# Altium footprint library ZYF_IC.PcbLib: 42 footprints (part 1 of 3)
Each footprint in its own frame and in the unit in brackets; x right, y up, seen from the top. Pads: shape width x height; smd on the part's side, far side on the other; paste and mask are expansions set on the pad; w line width, h text height; cw(c..) or ccw(c..) is an arc to the next point about the centre after c.
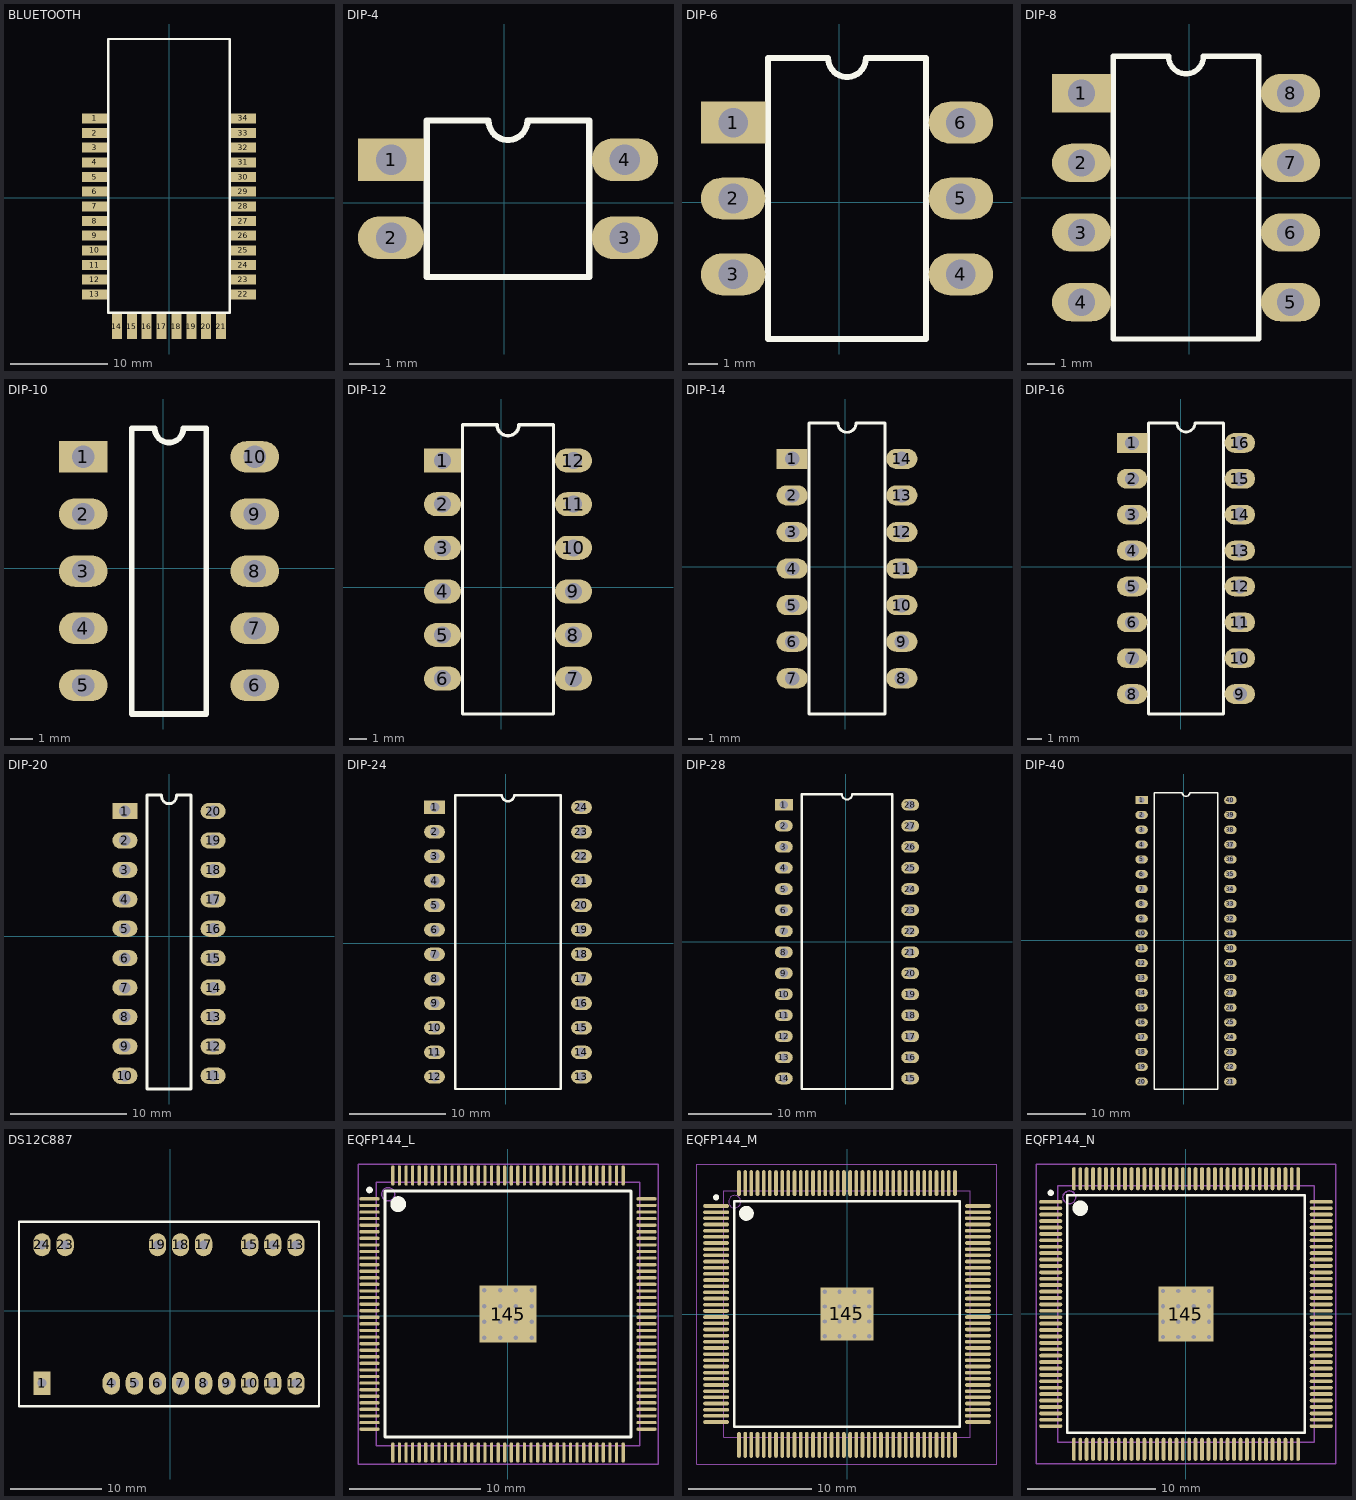
[diagram p0: the footprints below, top view; thin cyan lines are the x and y axes]

## BLUETOOTH [mil]
pads (34):
  rect 100x40 smd: 1(-300,320) 2(-300,260.83) 3(-300,201.67) 4(-300,142.5) 5(-300,83.33) 6(-300,24.17) 7(-300,-35) 8(-300,-94.17) 9(-300,-153.33) 10(-300,-212.5) 11(-300,-271.67) 12(-300,-330.83) 13(-300,-390) 22(300,-390) 23(300,-330.83) 24(300,-271.67) 25(300,-212.5) 26(300,-153.33) 27(300,-94.17) 28(300,-35) 29(300,24.17) 30(300,83.33) 31(300,142.5) 32(300,201.67) 33(300,260.83) 34(300,320)
  rect 40x100 smd: 14(-210,-520) 15(-150,-520) 16(-90,-520) 17(-30,-520) 18(30,-520) 19(90,-520) 20(150,-520) 21(210,-520)
Top Overlay:
  lines w10: -245,-465 245,-465 245,640 -245,640 -245,-465

## DIP-4 [mil]
pads (4):
  rect 85x55 hole 39: 1(-145,55)
  oval 85x55 hole 39: 2(-145,-45) 3(155,-45) 4(155,55)
Top Overlay:
  lines w7.87: -99.33,-95.39 109.33,-95.39 109.33,105.39 30,105.39 cw(c5,105.39) -20,105.39 -99.33,105.39 -99.33,-95.39
3D body: height 169.69, standoff -129.13, extent -147.48,-105 167.48,113.11

## DIP-6 [mil]
pads (6):
  rect 85x55 hole 39 paste+0 mask+4: 1(-140,105)
  oval 85x55 hole 39 paste+0 mask+4: 2(-140,5) 3(-140,-95) 4(160,-95) 5(160,5) 6(160,105)
Top Overlay:
  lines w7.87: -94.33,-180.04 -94.33,190.04 -15,190.04 ccw(c10,190.04) 35,190.04 114.33,190.04 114.33,-180.04 -94.33,-180.04
3D body: height 208.66, standoff -78.74, extent -144.92,-140 164.92,140.31

## DIP-8 [mil]
pads (8):
  rect 85x55 hole 39: 1(-155,150)
  oval 85x55 hole 39: 2(-155,50) 3(-155,-50) 4(-155,-150) 5(145,-150) 6(145,-50) 7(145,50) 8(145,150)
Top Overlay:
  lines w7.87: -109.33,-202.76 99.33,-202.76 99.33,202.76 20,202.76 cw(c-5,202.76) -30,202.76 -109.33,202.76 -109.33,-202.76
3D body: height 200, standoff -137.8, extent -159.91,-204.95 149.93,224.97

## DIP-10 [mil]
pads (10):
  rect 85x55 hole 39: 1(-140,195)
  oval 85x55 hole 39: 2(-140,95) 3(-140,-5) 4(-140,-105) 5(-140,-205) 6(160,-205) 7(160,-105) 8(160,-5) 9(160,95) 10(160,195)
Top Overlay:
  lines w10: -55,-255 75,-255 75,245 35,245 cw(c10,245) -15,245 -55,245 -55,-255

## DIP-12 [mil]
pads (12):
  rect 85x55 hole 39: 1(-135,290)
  oval 85x55 hole 39: 2(-135,190) 3(-135,90) 4(-135,-10) 5(-135,-110) 6(-135,-210) 7(165,-210) 8(165,-110) 9(165,-10) 10(165,90) 11(165,190) 12(165,290)
Top Overlay:
  lines w7.87: -89.33,-291.1 119.33,-291.1 119.33,371.89 40,371.89 cw(c15,371.89) -10,371.89 -89.33,371.89 -89.33,-291.1

## DIP-14 [mil]
pads (14):
  rect 85x55 hole 39: 1(-145,295)
  oval 85x55 hole 39: 2(-145,195) 3(-145,95) 4(-145,-5) 5(-145,-105) 6(-145,-205) 7(-145,-305) 8(155,-305) 9(155,-205) 10(155,-105) 11(155,-5) 12(155,95) 13(155,195) 14(155,295)
Top Overlay:
  lines w7.87: -99.33,-402.64 -99.33,392.64 -20,392.64 ccw(c5,392.64) 30,392.64 109.33,392.64 109.33,-402.64 -99.33,-402.64
3D body: height 200.79, standoff -129.92, extent -144.91,-403.69 164.93,383.71

## DIP-16 [mil]
pads (16):
  rect 85x55 hole 39: 1(-135,345)
  oval 85x55 hole 39: 2(-135,245) 3(-135,145) 4(-135,45) 5(-135,-55) 6(-135,-155) 7(-135,-255) 8(-135,-355) 9(165,-355) 10(165,-255) 11(165,-155) 12(165,-55) 13(165,45) 14(165,145) 15(165,245) 16(165,345)
Top Overlay:
  lines w7.87: -89.33,-410.51 119.33,-410.51 119.33,400.51 40,400.51 cw(c15,400.51) -10,400.51 -89.33,400.51 -89.33,-410.51
3D body: height 200.79, standoff -129.92, extent -139.92,-403.69 169.93,383.7

## DIP-20 [mil]
pads (20):
  rect 85x55 hole 39: 1(-150,425)
  oval 85x55 hole 39: 2(-150,325) 3(-150,225) 4(-150,125) 5(-150,25) 6(-150,-75) 7(-150,-175) 8(-150,-275) 9(-150,-375) 10(-150,-475) 11(150,-475) 12(150,-375) 13(150,-275) 14(150,-175) 15(150,-75) 16(150,25) 17(150,125) 18(150,225) 19(150,325) 20(150,425)
Top Overlay:
  lines w10: -25,480 -75,480 -75,-520 75,-520 75,480 25,480 ; -24.82,477.98 ccw(c0,475) 24.82,477.98
3D body: height 177.17, standoff -137.8, extent -152.77,-520.37 152.77,487.5

## DIP-24 [mil]
pads (24):
  rect 85x55 hole 39: 1(-290,555)
  oval 85x55 hole 39: 2(-290,455) 3(-290,355) 4(-290,255) 5(-290,155) 6(-290,55) 7(-290,-45) 8(-290,-145) 9(-290,-245) 10(-290,-345) 11(-290,-445) 12(-290,-545) 13(310,-545) 14(310,-445) 15(310,-345) 16(310,-245) 17(310,-145) 18(310,-45) 19(310,55) 20(310,155) 21(310,255) 22(310,355) 23(310,455) 24(310,555)
Top Overlay:
  lines w10: -205,-595 -205,605 -15,605 ccw(c10,605) 35,605 225,605 225,-595 -205,-595
3D body: height 224.41, standoff -101.57, extent -289.92,-635.03 319.92,635.05

## DIP-28 [mil]
pads (28):
  rect 85x55 hole 39: 1(-295,650)
  oval 85x55 hole 39: 2(-295,550) 3(-295,450) 4(-295,350) 5(-295,250) 6(-295,150) 7(-295,50) 8(-295,-50) 9(-295,-150) 10(-295,-250) 11(-295,-350) 12(-295,-450) 13(-295,-550) 14(-295,-650) 15(305,-650) 16(305,-550) 17(305,-450) 18(305,-350) 19(305,-250) 20(305,-150) 21(305,-50) 22(305,50) 23(305,150) 24(305,250) 25(305,350) 26(305,450) 27(305,550) 28(305,650)
Top Overlay:
  lines w10: -210,-700 220,-700 220,700 30,700 cw(c5,700) -20,700 -210,700 -210,-700
3D body: height 227.95, standoff -129.92, extent -294.91,-740.03 304.93,730.05

## DIP-40 [mil]
pads (40):
  rect 85x55 hole 39: 1(-285,945)
  oval 85x55 hole 39: 2(-285,845) 3(-285,745) 4(-285,645) 5(-285,545) 6(-285,445) 7(-285,345) 8(-285,245) 9(-285,145) 10(-285,45) 11(-285,-55) 12(-285,-155) 13(-285,-255) 14(-285,-355) 15(-285,-455) 16(-285,-555) 17(-285,-655) 18(-285,-755) 19(-285,-855) 20(-285,-955) 21(315,-955) 22(315,-855) 23(315,-755) 24(315,-655) 25(315,-555) 26(315,-455) 27(315,-355) 28(315,-255) 29(315,-155) 30(315,-55) 31(315,45) 32(315,145) 33(315,245) 34(315,345) 35(315,445) 36(315,545) 37(315,645) 38(315,745) 39(315,845) 40(315,945)
Top Overlay:
  lines w10: -200,-1005 -200,995 -10,995 ccw(c15,995) 40,995 230,995 230,-1005 -200,-1005
3D body: height 196.46, standoff -125.2, extent -285.23,-1045.43 325,1025.43

## DS12C887 [mil]
pads (18):
  rect 75x100 hole 39: 1(-555,-315)
  oval 75x100 hole 39: 4(-255,-315) 5(-155,-315) 6(-55,-315) 7(45,-315) 8(145,-315) 9(245,-315) 10(345,-315) 11(445,-315) 12(545,-315) 13(545,285) 14(445,285) 15(345,285) 17(145,285) 18(45,285) 19(-55,285) 23(-455,285) 24(-555,285)
Top Overlay:
  lines w10: -655,-415 645,-415 645,385 -655,385 -655,-415

## EQFP144_L [mm]
pads (145):
  oval 1.55x0.25 smd: 1(-10.51,8.889) 2(-10.51,8.389) 3(-10.51,7.889) 4(-10.51,7.389) 5(-10.51,6.889) 6(-10.51,6.389) 7(-10.51,5.889) 8(-10.51,5.389) 9(-10.51,4.889) 10(-10.51,4.389) 11(-10.51,3.889) 12(-10.51,3.389) 13(-10.51,2.889) 14(-10.51,2.389) 15(-10.51,1.889) 16(-10.51,1.389) 17(-10.51,0.889) 18(-10.51,0.389) 19(-10.51,-0.111) 20(-10.51,-0.611) 21(-10.51,-1.111) 22(-10.51,-1.611) 23(-10.51,-2.111) 24(-10.51,-2.611) 25(-10.51,-3.111) 26(-10.51,-3.611) 27(-10.51,-4.111) 28(-10.51,-4.611) 29(-10.51,-5.111) 30(-10.51,-5.611) 31(-10.51,-6.111) 32(-10.51,-6.611) 33(-10.51,-7.111) 34(-10.51,-7.611) 35(-10.51,-8.111) 36(-10.51,-8.611) 73(10.54,-8.611) 74(10.54,-8.111) 75(10.54,-7.611) 76(10.54,-7.111) 77(10.54,-6.611) 78(10.54,-6.111) 79(10.54,-5.611) 80(10.54,-5.111) 81(10.54,-4.611) 82(10.54,-4.111) 83(10.54,-3.611) 84(10.54,-3.111) 85(10.54,-2.611) 86(10.54,-2.111) 87(10.54,-1.611) 88(10.54,-1.111) 89(10.54,-0.611) 90(10.54,-0.111) 91(10.54,0.389) 92(10.54,0.889) 93(10.54,1.389) 94(10.54,1.889) 95(10.54,2.389) 96(10.54,2.889) 97(10.54,3.389) 98(10.54,3.889) 99(10.54,4.389) 100(10.54,4.889) 101(10.54,5.389) 102(10.54,5.889) 103(10.54,6.389) 104(10.54,6.889) 105(10.54,7.389) 106(10.54,7.889) 107(10.54,8.389) 108(10.54,8.889)
  oval 0.25x1.55 smd: 37(-8.735,-10.386) 38(-8.235,-10.386) 39(-7.735,-10.386) 40(-7.235,-10.386) 41(-6.735,-10.386) 42(-6.235,-10.386) 43(-5.735,-10.386) 44(-5.235,-10.386) 45(-4.735,-10.386) 46(-4.235,-10.386) 47(-3.735,-10.386) 48(-3.235,-10.386) 49(-2.735,-10.386) 50(-2.235,-10.386) 51(-1.735,-10.386) 52(-1.235,-10.386) 53(-0.735,-10.386) 54(-0.235,-10.386) 55(0.265,-10.386) 56(0.765,-10.386) 57(1.265,-10.386) 58(1.765,-10.386) 59(2.265,-10.386) 60(2.765,-10.386) 61(3.265,-10.386) 62(3.765,-10.386) 63(4.265,-10.386) 64(4.765,-10.386) 65(5.265,-10.386) 66(5.765,-10.386) 67(6.265,-10.386) 68(6.765,-10.386) 69(7.265,-10.386) 70(7.765,-10.386) 71(8.265,-10.386) 72(8.765,-10.386) 109(8.765,10.664) 110(8.265,10.664) 111(7.765,10.664) 112(7.265,10.664) 113(6.765,10.664) 114(6.265,10.664) 115(5.765,10.664) 116(5.265,10.664) 117(4.765,10.664) 118(4.265,10.664) 119(3.765,10.664) 120(3.265,10.664) 121(2.765,10.664) 122(2.265,10.664) 123(1.765,10.664) 124(1.265,10.664) 125(0.765,10.664) 126(0.265,10.664) 127(-0.235,10.664) 128(-0.735,10.664) 129(-1.235,10.664) 130(-1.735,10.664) 131(-2.235,10.664) 132(-2.735,10.664) 133(-3.235,10.664) 134(-3.735,10.664) 135(-4.235,10.664) 136(-4.735,10.664) 137(-5.235,10.664) 138(-5.735,10.664) 139(-6.235,10.664) 140(-6.735,10.664) 141(-7.235,10.664) 142(-7.735,10.664) 143(-8.235,10.664) 144(-8.735,10.664)
  rect 4.3x4.3 smd: 145(0.015,0.139)
via -1.785,1.939 diameter 0.66 hole 0.33
via -0.585,1.939 diameter 0.66 hole 0.33
via 0.615,1.939 diameter 0.66 hole 0.33
via 1.815,1.939 diameter 0.66 hole 0.33
via -1.785,0.739 diameter 0.66 hole 0.33
via -0.585,0.739 diameter 0.66 hole 0.33
via 0.615,0.739 diameter 0.66 hole 0.33
via 1.815,0.739 diameter 0.66 hole 0.33
via -1.785,-0.461 diameter 0.66 hole 0.33
via -0.585,-0.461 diameter 0.66 hole 0.33
via 0.615,-0.461 diameter 0.66 hole 0.33
via 1.815,-0.461 diameter 0.66 hole 0.33
via -1.785,-1.661 diameter 0.66 hole 0.33
via -0.585,-1.661 diameter 0.66 hole 0.33
via 0.615,-1.661 diameter 0.66 hole 0.33
via 1.815,-1.661 diameter 0.66 hole 0.33
Top Overlay:
  circle w0.25: c-10.51,9.564 r0.125
  circle w0.6: c-8.335,8.489 r0.3
  lines w0.2: -9.335,-9.211 -9.335,9.489 9.365,9.489 9.365,-9.211 -9.335,-9.211
Mechanical 13:
  circle w0.1: c-9.085,9.239 r0.5
  lines w0.1: -9.985,-9.861 -9.985,10.139 10.015,10.139 10.015,-9.861 -9.985,-9.861
Mechanical 15:
  lines w0.1: -0.485,0.139 0.515,0.139 ; 0.015,-0.361 0.015,0.639 ; -11.385,-11.261 -11.385,11.539 11.415,11.539 11.415,-11.261 -11.385,-11.261
3D body: height 1.6, standoff 0, extent -9.985,-9.861 10.015,10.139

## EQFP144_M [mm]
pads (145):
  oval 2.1x0.3 smd: 1(-10.635,8.777) 2(-10.635,8.277) 3(-10.635,7.777) 4(-10.635,7.277) 5(-10.635,6.777) 6(-10.635,6.277) 7(-10.635,5.777) 8(-10.635,5.277) 9(-10.635,4.777) 10(-10.635,4.277) 11(-10.635,3.777) 12(-10.635,3.277) 13(-10.635,2.777) 14(-10.635,2.277) 15(-10.635,1.777) 16(-10.635,1.277) 17(-10.635,0.777) 18(-10.635,0.277) 19(-10.635,-0.223) 20(-10.635,-0.723) 21(-10.635,-1.223) 22(-10.635,-1.723) 23(-10.635,-2.223) 24(-10.635,-2.723) 25(-10.635,-3.223) 26(-10.635,-3.723) 27(-10.635,-4.223) 28(-10.635,-4.723) 29(-10.635,-5.223) 30(-10.635,-5.723) 31(-10.635,-6.223) 32(-10.635,-6.723) 33(-10.635,-7.223) 34(-10.635,-7.723) 35(-10.635,-8.223) 36(-10.635,-8.723) 73(10.565,-8.723) 74(10.565,-8.223) 75(10.565,-7.723) 76(10.565,-7.223) 77(10.565,-6.723) 78(10.565,-6.223) 79(10.565,-5.723) 80(10.565,-5.223) 81(10.565,-4.723) 82(10.565,-4.223) 83(10.565,-3.723) 84(10.565,-3.223) 85(10.565,-2.723) 86(10.565,-2.223) 87(10.565,-1.723) 88(10.565,-1.223) 89(10.565,-0.723) 90(10.565,-0.223) 91(10.565,0.277) 92(10.565,0.777) 93(10.565,1.277) 94(10.565,1.777) 95(10.565,2.277) 96(10.565,2.777) 97(10.565,3.277) 98(10.565,3.777) 99(10.565,4.277) 100(10.565,4.777) 101(10.565,5.277) 102(10.565,5.777) 103(10.565,6.277) 104(10.565,6.777) 105(10.565,7.277) 106(10.565,7.777) 107(10.565,8.277) 108(10.565,8.777)
  oval 0.3x2.1 smd: 37(-8.785,-10.573) 38(-8.285,-10.573) 39(-7.785,-10.573) 40(-7.285,-10.573) 41(-6.785,-10.573) 42(-6.285,-10.573) 43(-5.785,-10.573) 44(-5.285,-10.573) 45(-4.785,-10.573) 46(-4.285,-10.573) 47(-3.785,-10.573) 48(-3.285,-10.573) 49(-2.785,-10.573) 50(-2.285,-10.573) 51(-1.785,-10.573) 52(-1.285,-10.573) 53(-0.785,-10.573) 54(-0.285,-10.573) 55(0.215,-10.573) 56(0.715,-10.573) 57(1.215,-10.573) 58(1.715,-10.573) 59(2.215,-10.573) 60(2.715,-10.573) 61(3.215,-10.573) 62(3.715,-10.573) 63(4.215,-10.573) 64(4.715,-10.573) 65(5.215,-10.573) 66(5.715,-10.573) 67(6.215,-10.573) 68(6.715,-10.573) 69(7.215,-10.573) 70(7.715,-10.573) 71(8.215,-10.573) 72(8.715,-10.573) 109(8.715,10.627) 110(8.215,10.627) 111(7.715,10.627) 112(7.215,10.627) 113(6.715,10.627) 114(6.215,10.627) 115(5.715,10.627) 116(5.215,10.627) 117(4.715,10.627) 118(4.215,10.627) 119(3.715,10.627) 120(3.215,10.627) 121(2.715,10.627) 122(2.215,10.627) 123(1.715,10.627) 124(1.215,10.627) 125(0.715,10.627) 126(0.215,10.627) 127(-0.285,10.627) 128(-0.785,10.627) 129(-1.285,10.627) 130(-1.785,10.627) 131(-2.285,10.627) 132(-2.785,10.627) 133(-3.285,10.627) 134(-3.785,10.627) 135(-4.285,10.627) 136(-4.785,10.627) 137(-5.285,10.627) 138(-5.785,10.627) 139(-6.285,10.627) 140(-6.785,10.627) 141(-7.285,10.627) 142(-7.785,10.627) 143(-8.285,10.627) 144(-8.785,10.627)
  rect 4.3x4.3 smd: 145(-0.035,0.027)
via 1.765,-1.773 diameter 0.66 hole 0.33
via 0.565,-1.773 diameter 0.66 hole 0.33
via -0.635,-1.773 diameter 0.66 hole 0.33
via -1.835,-1.773 diameter 0.66 hole 0.33
via 1.765,-0.573 diameter 0.66 hole 0.33
via 0.565,-0.573 diameter 0.66 hole 0.33
via -0.635,-0.573 diameter 0.66 hole 0.33
via -1.835,-0.573 diameter 0.66 hole 0.33
via 1.765,0.627 diameter 0.66 hole 0.33
via 0.565,0.627 diameter 0.66 hole 0.33
via -0.635,0.627 diameter 0.66 hole 0.33
via -1.835,0.627 diameter 0.66 hole 0.33
via 1.765,1.827 diameter 0.66 hole 0.33
via 0.565,1.827 diameter 0.66 hole 0.33
via -0.635,1.827 diameter 0.66 hole 0.33
via -1.835,1.827 diameter 0.66 hole 0.33
Top Overlay:
  circle w0.25: c-10.635,9.477 r0.125
  circle w0.6: c-8.185,8.177 r0.3
  lines w0.2: -9.185,-9.123 -9.185,9.177 9.115,9.177 9.115,-9.123 -9.185,-9.123
Mechanical 13:
  circle w0.1: c-9.135,9.127 r0.5
  lines w0.1: -10.035,-9.973 -10.035,10.027 9.965,10.027 9.965,-9.973 -10.035,-9.973
Mechanical 15:
  lines w0.1: -0.535,0.027 0.465,0.027 ; -0.035,-0.473 -0.035,0.527 ; -12.185,-12.123 -12.185,12.177 12.115,12.177 12.115,-12.123 -12.185,-12.123
3D body: height 1.6, standoff 0.05, extent -10.035,-9.973 9.965,10.027

## EQFP144_N [mm]
pads (145):
  oval 1.8x0.3 smd: 1(-10.55,8.746) 2(-10.55,8.246) 3(-10.55,7.746) 4(-10.55,7.246) 5(-10.55,6.746) 6(-10.55,6.246) 7(-10.55,5.746) 8(-10.55,5.246) 9(-10.55,4.746) 10(-10.55,4.246) 11(-10.55,3.746) 12(-10.55,3.246) 13(-10.55,2.746) 14(-10.55,2.246) 15(-10.55,1.746) 16(-10.55,1.246) 17(-10.55,0.746) 18(-10.55,0.246) 19(-10.55,-0.254) 20(-10.55,-0.754) 21(-10.55,-1.254) 22(-10.55,-1.754) 23(-10.55,-2.254) 24(-10.55,-2.754) 25(-10.55,-3.254) 26(-10.55,-3.754) 27(-10.55,-4.254) 28(-10.55,-4.754) 29(-10.55,-5.254) 30(-10.55,-5.754) 31(-10.55,-6.254) 32(-10.55,-6.754) 33(-10.55,-7.254) 34(-10.55,-7.754) 35(-10.55,-8.254) 36(-10.55,-8.754) 73(10.55,-8.754) 74(10.55,-8.254) 75(10.55,-7.754) 76(10.55,-7.254) 77(10.55,-6.754) 78(10.55,-6.254) 79(10.55,-5.754) 80(10.55,-5.254) 81(10.55,-4.754) 82(10.55,-4.254) 83(10.55,-3.754) 84(10.55,-3.254) 85(10.55,-2.754) 86(10.55,-2.254) 87(10.55,-1.754) 88(10.55,-1.254) 89(10.55,-0.754) 90(10.55,-0.254) 91(10.55,0.246) 92(10.55,0.746) 93(10.55,1.246) 94(10.55,1.746) 95(10.55,2.246) 96(10.55,2.746) 97(10.55,3.246) 98(10.55,3.746) 99(10.55,4.246) 100(10.55,4.746) 101(10.55,5.246) 102(10.55,5.746) 103(10.55,6.246) 104(10.55,6.746) 105(10.55,7.246) 106(10.55,7.746) 107(10.55,8.246) 108(10.55,8.746)
  oval 0.3x1.8 smd: 37(-8.75,-10.554) 38(-8.25,-10.554) 39(-7.75,-10.554) 40(-7.25,-10.554) 41(-6.75,-10.554) 42(-6.25,-10.554) 43(-5.75,-10.554) 44(-5.25,-10.554) 45(-4.75,-10.554) 46(-4.25,-10.554) 47(-3.75,-10.554) 48(-3.25,-10.554) 49(-2.75,-10.554) 50(-2.25,-10.554) 51(-1.75,-10.554) 52(-1.25,-10.554) 53(-0.75,-10.554) 54(-0.25,-10.554) 55(0.25,-10.554) 56(0.75,-10.554) 57(1.25,-10.554) 58(1.75,-10.554) 59(2.25,-10.554) 60(2.75,-10.554) 61(3.25,-10.554) 62(3.75,-10.554) 63(4.25,-10.554) 64(4.75,-10.554) 65(5.25,-10.554) 66(5.75,-10.554) 67(6.25,-10.554) 68(6.75,-10.554) 69(7.25,-10.554) 70(7.75,-10.554) 71(8.25,-10.554) 72(8.75,-10.554) 109(8.75,10.546) 110(8.25,10.546) 111(7.75,10.546) 112(7.25,10.546) 113(6.75,10.546) 114(6.25,10.546) 115(5.75,10.546) 116(5.25,10.546) 117(4.75,10.546) 118(4.25,10.546) 119(3.75,10.546) 120(3.25,10.546) 121(2.75,10.546) 122(2.25,10.546) 123(1.75,10.546) 124(1.25,10.546) 125(0.75,10.546) 126(0.25,10.546) 127(-0.25,10.546) 128(-0.75,10.546) 129(-1.25,10.546) 130(-1.75,10.546) 131(-2.25,10.546) 132(-2.75,10.546) 133(-3.25,10.546) 134(-3.75,10.546) 135(-4.25,10.546) 136(-4.75,10.546) 137(-5.25,10.546) 138(-5.75,10.546) 139(-6.25,10.546) 140(-6.75,10.546) 141(-7.25,10.546) 142(-7.75,10.546) 143(-8.25,10.546) 144(-8.75,10.546)
  rect 4.3x4.3 smd: 145(0,-0.004)
via 1.8,-1.804 diameter 0.66 hole 0.33
via 0.6,-1.804 diameter 0.66 hole 0.33
via -0.6,-1.804 diameter 0.66 hole 0.33
via -1.8,-1.804 diameter 0.66 hole 0.33
via 1.8,-0.604 diameter 0.66 hole 0.33
via 0.6,-0.604 diameter 0.66 hole 0.33
via -0.6,-0.604 diameter 0.66 hole 0.33
via -1.8,-0.604 diameter 0.66 hole 0.33
via 1.8,0.596 diameter 0.66 hole 0.33
via 0.6,0.596 diameter 0.66 hole 0.33
via -0.6,0.596 diameter 0.66 hole 0.33
via -1.8,0.596 diameter 0.66 hole 0.33
via 1.8,1.796 diameter 0.66 hole 0.33
via 0.6,1.796 diameter 0.66 hole 0.33
via -0.6,1.796 diameter 0.66 hole 0.33
via -1.8,1.796 diameter 0.66 hole 0.33
Top Overlay:
  circle w0.6: c-8.25,8.246 r0.3
  circle w0.25: c-10.55,9.446 r0.125
  lines w0.2: -9.25,-9.254 9.25,-9.254 9.25,9.246 -9.25,9.246 -9.25,-9.254
Mechanical 13:
  circle w0.1: c-9.1,9.096 r0.5
  lines w0.1: -10,-10.004 10,-10.004 10,9.996 -10,9.996 -10,-10.004
Mechanical 15:
  lines w0.1: -0.5,-0.004 0.5,-0.004 ; 0,-0.504 0,0.496 ; -11.7,-11.704 11.7,-11.704 11.7,11.696 -11.7,11.696 -11.7,-11.704
3D body: height 1.6, standoff 0, extent -10,-10.004 10,9.996